# Altium footprint library SMD_Bauteile.PcbLib: 355 footprints (part 2 of 23)
Each footprint in its own frame and in the unit in brackets; x right, y up, seen from the top. Pads: shape width x height; smd on the part's side, far side on the other; paste and mask are expansions set on the pad; w line width, h text height; cw(c..) or ccw(c..) is an arc to the next point about the centre after c.
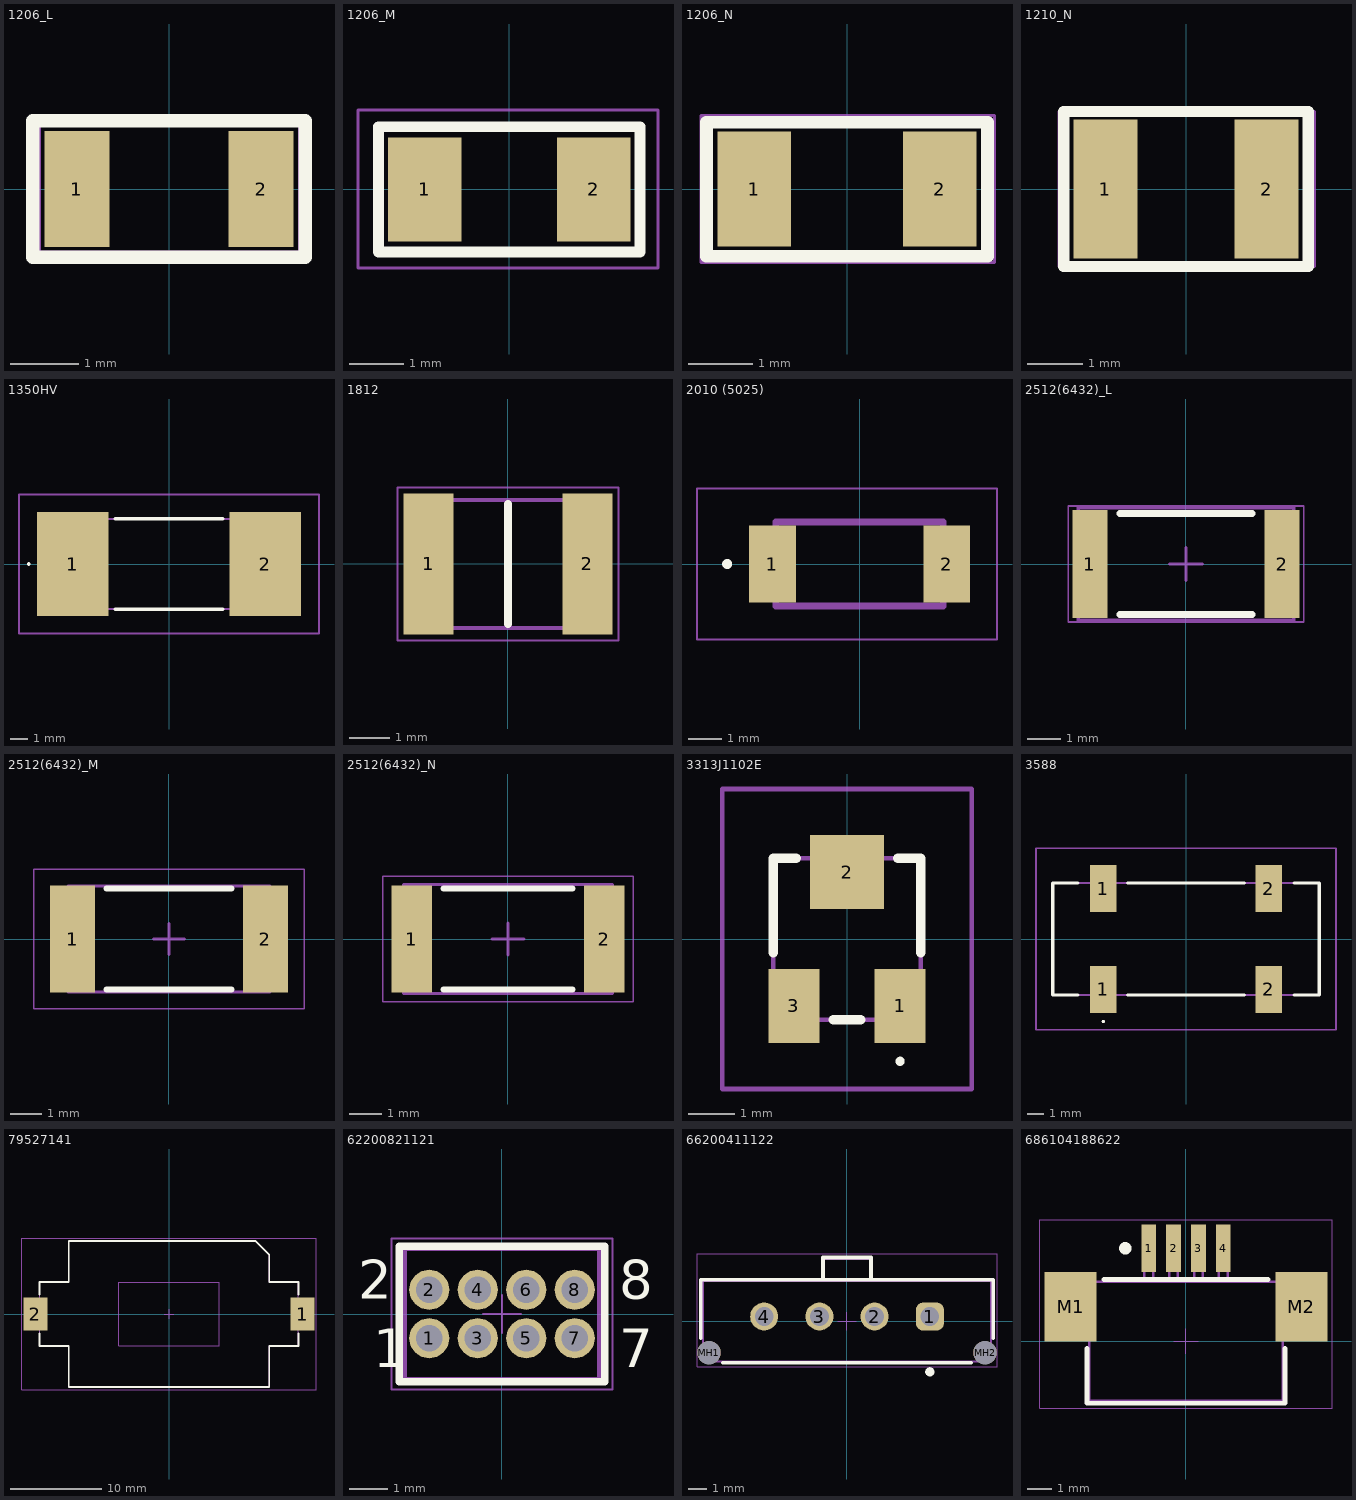
[diagram p1: the footprints below, top view; thin cyan lines are the x and y axes]

## 1206_L [mm]
pads (2):
  rect 0.95x1.7 smd: 1(-1.35,0) 2(1.35,0)
Top Overlay:
  lines w0.2: -2,-1 -2,1 2,1 2,-1 -2,-1
Mech 15:
  lines w0.05: -1.9,-0.924 -1.9,0.976 1.914,0.976 1.914,-0.924 -1.9,-0.924
3D body: height 0.8, standoff 0, extent -0.889,-0.635 1.143,0.635

## 1206_M [mm]
pads (2):
  rect 1.35x1.9 smd: 1(-1.55,0) 2(1.55,0)
Top Overlay:
  lines w0.2: -2.4,-1.15 -2.4,1.15 2.4,1.15 2.4,-1.15 -2.4,-1.15
Mech 15:
  lines w0.05: -2.773,-1.442 -2.773,1.458 2.727,1.458 2.727,-1.442 -2.773,-1.442
3D body: height 0.8, standoff 0, extent -1.016,-0.635 1.016,0.635

## 1206_N [mm]
pads (2):
  rect 1.15x1.8 smd: 1(-1.45,0) 2(1.45,0)
Top Overlay:
  lines w0.2: -2.2,-1.05 -2.2,1.05 2.2,1.05 2.2,-1.05 -2.2,-1.05
Mech 15:
  lines w0.05: -2.288,-1.148 2.312,-1.148 2.312,1.152 -2.288,1.152 -2.288,-1.148
3D body: height 0.8, standoff 0, extent -1.016,-0.635 1.016,0.635

## 1210_N [mm]
pads (2):
  rect 1.15x2.5 smd: 1(-1.45,0) 2(1.45,0)
Top Overlay:
  lines w0.2: -2.2,-1.397 -2.2,1.397 2.2,1.397 2.2,-1.397 -2.2,-1.397
Mech 15:
  lines w0.05: -2.288,-1.397 2.312,-1.397 2.312,1.397 -2.288,1.397 -2.288,-1.397
3D body "Download_STP_885012x09xxx (rev1).stp": height 2.55, standoff 0.05, extent -1.6,-1.25 1.6,1.25

## 1350HV [mm] "Surface Mount Fuses 600V (DC) FAST ACTING"
height 5.5
pads (2):
  rect 4x5.8 smd: 1(-5.4,0) 2(5.4,0)
Top Overlay:
  lines w0.1: -7.9,0 cw(c-7.85,0) -7.8,0 cw(c-7.85,0) -7.9,0
  lines w0.2: -3,-2.525 3,-2.525 ; -3,2.525 3,2.525
Mech Misc 1:
  lines w0.1: -6.6,-2.525 6.6,-2.525 6.6,2.525 -6.6,2.525 -6.6,-2.525
Mech 15:
  lines w0.1: -8.4,-3.9 8.4,-3.9 8.4,3.9 -8.4,3.9 -8.4,-3.9
3D body "TR-1350HV1-6-R.stp": height 5.12, standoff 0.05, extent -6.5,-2.545 6.5,2.525

## 1812 [mm]
pads (2):
  rect 1.25x3.52 smd: 1(-1.98,0) 2(1.98,0)
Top Overlay:
  lines w0.2: 0,-1.5 0,1.5
Mech Misc 1:
  lines w0.1: -2.25,-1.6 -2.25,1.6 2.25,1.6 2.25,-1.6 -2.25,-1.6
Mech 15:
  lines w0.05: -2.755,-1.91 -2.755,1.91 2.755,1.91 2.755,-1.91 -2.755,-1.91
3D body "CKC18C473KWGACAUTO.stp": height 2.7, standoff 0, extent -2.25,-1.6 2.25,1.6

## 2010 (5025) [mm]
pads (2):
  rect 1.4x2.3 smd: 1(-2.6,0) 2(2.6,0)
Top Overlay:
  circle w0.2: c-3.95,0 r0.05
Mech 15:
  lines w0.2: -2.5,-1.25 2.5,-1.25 2.5,1.25 -2.5,1.25 -2.5,-1.25
Top 3D Body:
  lines w0.05: -4.85,-2.25 4.1,-2.25 4.1,2.25 -4.85,2.25 -4.85,-2.25

## 2512(6432)_L [mm] "Chip Resistor, Body 6.4x3.2mm, IPC High Density"
height 0.75
pads (2):
  rect 1.05x3.25 smd: 1(-2.9,0) 2(2.9,0)
Top Overlay:
  lines w0.2: -2,-1.525 2,-1.525 ; -2,1.525 2,1.525
Mech Misc 1:
  lines w0.1: -3.25,-1.7 -3.25,1.7 3.25,1.7 3.25,-1.7 -3.25,-1.7
Mech 15:
  lines w0.05: -3.55,-1.75 -3.55,1.75 3.55,1.75 3.55,-1.75 -3.55,-1.75
  lines w0.1: -0.5,0 0.5,0 ; 0,-0.5 0,0.5
3D body: height 0.75, standoff 0, extent 2.63,-1.7 3.25,1.7
3D body: height 0.75, standoff 0, extent -2.63,-1.7 2.63,1.7
3D body: height 0.75, standoff 0, extent -3.25,-1.7 -2.63,1.7

## 2512(6432)_M [mm] "Chip Resistor, Body 6.4x3.2mm, IPC Low Density"
height 0.75
pads (2):
  rect 1.45x3.45 smd: 1(-3.1,0) 2(3.1,0)
Top Overlay:
  lines w0.2: -2,-1.625 2,-1.625 ; -2,1.625 2,1.625
Mech Misc 1:
  lines w0.1: -3.25,-1.7 -3.25,1.7 3.25,1.7 3.25,-1.7 -3.25,-1.7
Mech 15:
  lines w0.05: -4.35,-2.25 -4.35,2.25 4.35,2.25 4.35,-2.25 -4.35,-2.25
  lines w0.1: -0.5,0 0.5,0 ; 0,-0.5 0,0.5
3D body: height 0.75, standoff 0, extent -3.25,-1.7 -2.63,1.7
3D body: height 0.75, standoff 0, extent -2.63,-1.7 2.63,1.7
3D body: height 0.75, standoff 0, extent 2.63,-1.7 3.25,1.7

## 2512(6432)_N [mm] "Chip Resistor, Body 6.4x3.2mm, IPC Medium Density"
height 0.75
pads (2):
  rect 1.25x3.35 smd: 1(-3,0) 2(3,0)
Top Overlay:
  lines w0.2: -2,-1.575 2,-1.575 ; -2,1.575 2,1.575
Mech Misc 1:
  lines w0.1: -3.25,-1.7 3.25,-1.7 3.25,1.7 -3.25,1.7 -3.25,-1.7
Mech 15:
  lines w0.05: -3.9,-1.95 3.9,-1.95 3.9,1.95 -3.9,1.95 -3.9,-1.95
  lines w0.1: -0.5,0 0.5,0 ; 0,-0.5 0,0.5
3D body: height 0.75, standoff 0, extent -3.25,-1.7 -2.63,1.7
3D body: height 0.75, standoff 0, extent -2.63,-1.7 2.63,1.7
3D body: height 0.75, standoff 0, extent 2.63,-1.7 3.25,1.7

## 3313J1102E [mm]
pads (3):
  rect 1.1x1.6 smd: 1(1.15,-1.45) 3(-1.15,-1.45)
  rect 1.6x1.6 smd: 2(0,1.45)
Top Overlay:
  lines w0.1: 1.15,-2.7 ccw(c1.15,-2.65) 1.15,-2.6 ccw(c1.15,-2.65) 1.15,-2.7
  lines w0.2: -1.6,-0.3 -1.6,1.75 -1.1,1.75 ; -0.3,-1.75 0.3,-1.75 ; 1.1,1.75 1.6,1.75 1.6,-0.3
Mech Misc 1:
  lines w0.1: -1.6,-1.75 -1.6,1.75 1.6,1.75 1.6,-1.75 -1.6,-1.75
Mech 15:
  lines w0.1: -2.7,-3.25 -2.7,3.25 2.7,3.25 2.7,-3.25 -2.7,-3.25
3D body "3313J-1-102E.stp": height 2.4, standoff 0, extent -1.6,-1.75 1.6,1.75

## 3588 [mm]
pads (4):
  rect 1.57x2.82 smd: 1(-4.96,-3.03) 1(-4.96,3.03) 2(4.96,-3.03) 2(4.96,3.03)
Top Overlay:
  lines w0.1: -4.96,-5 ccw(c-4.96,-4.95) -4.96,-4.9 ccw(c-4.96,-4.95) -4.96,-5
  lines w0.2: -6.5,-3.365 -8,-3.365 -8,3.365 -6.5,3.365 ; -3.5,-3.365 3.5,-3.365 ; -3.5,3.365 3.5,3.365 ; 6.5,-3.365 8,-3.365 8,3.365 6.5,3.365
Mech Misc 1:
  lines w0.1: -8,-3.365 8,-3.365 8,3.365 -8,3.365 -8,-3.365
Mech 15:
  lines w0.1: -9,-5.44 9,-5.44 9,5.44 -9,5.44 -9,-5.44
3D body "3D_model_0297000_WXT_MINI.stp": height 17.76, standoff 1.5, extent -5.197,-1.725 5.725,2.085
3D body "3588.stp": height 7.88, standoff 0, extent -7.906,-4.004 8.096,4.752

## 79527141 [mm] "Battery Holder"
height 5.65
pads (2):
  rect 2.6x3.6 smd: 1(14.65,0) 2(-14.65,0)
Top Overlay:
  lines w0.2: -14.2,-2.15 -14.2,-3.5 -11,-3.5 -11,-8 11,-8 11,-3.5 14.2,-3.5 14.2,-2.15 ; -14.2,2.15 -14.2,3.5 -11,3.5 -11,8 9.5,8 11,6.5 11,3.5 14.2,3.5 14.2,2.15
Bottom Designator:
  lines w0.05: -0.5,0 0.5,0 ; 0,-0.5 0,0.5 ; -16.15,-8.3 -16.15,8.3 16.15,8.3 16.15,-8.3 -16.15,-8.3
  lines w0.1: 1.5,3.5 5.5,3.5 ; 5.5,3.5 5.5,-3.5 -5.5,-3.5 -5.5,3.5 5.5,3.5
  text "ZONE FOR ADHESIVE FIXATION" at -7,-4.989 h1
Top Courtyard (Mech14):
  lines w0.1: -14.2,-3.5 -11,-3.5 -11,-8 11,-8 11,-3.5 14.2,-3.5 14.2,3.5 11,3.5 11,6.5 9.5,8 -11,8 -11,3.5 -14.2,3.5 -14.2,-3.5
Mechanical 18:
  lines w0.1: -14.2,-3.5 -14.2,3.5 -11,3.5 -11,8 9.5,8 11,6.5 11,3.5 14.2,3.5 14.2,-3.5 11,-3.5 11,-8 -11,-8 -11,-3.5 -14.2,-3.5
Top 3D Body:
  text ".Designator" at -7.498,-0.5 h1.5
Top Component Outline:
  lines w0.1: 1.5,3.5 5.5,3.5 ; 5.5,3.5 5.5,-3.5 -5.5,-3.5 -5.5,3.5 5.5,3.5
3D body "79527141 (rev1).stp": height 5.66, standoff 0.01, extent -15.95,-8 15.95,8

## 62200821121 [mm] "Pin Header, pitch 1.27 mm, THT, Vertical, dual row, 8p"
height 5.65
pads (8):
  round 1.05 hole 0.7: 1(-1.905,-0.635) 2(-1.905,0.635) 3(-0.635,-0.635) 4(-0.635,0.635) 5(0.635,-0.635) 6(0.635,0.635) 7(1.905,-0.635) 8(1.905,0.635)
Top Overlay:
  lines w0.2: -2.69,-1.775 -2.69,1.775 2.69,1.775 2.69,-1.775 -2.69,-1.775
  text "7" at 3.07,-1.4 h1.02
  text "8" at 3.07,0.4 h1.02
  text "1" at -3.37,-1.4 h1.02
  text "2" at -3.77,0.4 h1.02
Mech Misc 1:
  lines w0.1: -2.54,-1.7 -2.54,1.7 2.54,1.7 2.54,-1.7 -2.54,-1.7
Mech 15:
  lines w0.05: -0.5,0 0.5,0 ; 0,-0.5 0,0.5 ; -2.89,-1.975 -2.89,1.975 2.89,1.975 2.89,-1.975 -2.89,-1.975
3D body "62200821121.stp": height 5.33, standoff -2.27, extent -2.54,-1.7 2.54,1.7

## 66200411122 [mm] "3.00mm Male Single Row Vertical Header, 4p"
height 11
pads (6):
  rrect50% 1.52x1.52 hole 1.02: 1(4.5,0.255)
  round 1.52 hole 1.02: 2(1.5,0.255) 3(-1.5,0.255) 4(-4.5,0.255)
  round 1.27 hole 1.27 unplated: MH1(-7.5,-1.705) MH2(7.5,-1.705)
Top Overlay:
  circle w0.25: c4.5,-2.75 r0.125
  lines w0.2: -7.95,-0.91 -7.95,2.26 7.95,2.26 7.95,-0.91 ; -6.755,-2.26 6.755,-2.26 ; -1.3,2.26 -1.3,3.46 1.3,3.46 1.3,2.26
Bottom Designator:
  lines w0.05: -0.5,0 0.5,0 ; 0,-0.5 0,0.5 ; -8.15,-2.46 8.15,-2.46 8.15,3.66 -8.15,3.66 -8.15,-2.46
Top Courtyard (Mech14):
  lines w0.1: -1.3,2.185 -1.3,3.385 1.3,3.385 1.3,2.185 ; 7.825,-2.185 7.825,2.185 -7.825,2.185 -7.825,-2.185 7.83,-2.185
Mechanical 18:
  lines w0.1: -1.3,2.185 -1.3,3.385 1.3,3.385 1.3,2.185 ; 7.825,-2.185 7.825,2.185 -7.825,2.185 -7.825,-2.185 7.83,-2.185
Top 3D Body:
  text ".Designator" at -7.498,-0.5 h1.5
3D body "66200411122.stp": height 9.93, standoff -3.15, extent -7.822,-2.185 7.828,3.385

## 686104188622 [mm] "LIF Connectors, Horizontal, Top Contact, pitch 1mm, 4p"
height 3.1
pads (6):
  rect 0.6x1.9 smd: 1(-1.5,3.75) 2(-0.5,3.75) 3(0.5,3.75) 4(1.5,3.75)
  rect 2.1x2.8 smd: M1(-4.65,1.4) M2(4.65,1.4)
Top Overlay:
  circle w0.25: c-2.45,3.75 r0.125
  lines w0.2: -4,-0.3 -4,-2.5 4,-2.5 4,-0.3 ; -3.3,2.5 3.3,2.5
Bottom Designator:
  lines w0.05: -0.5,0 0.5,0 ; 0,-0.5 0,0.5 ; -5.9,-2.7 5.9,-2.7 5.9,4.9 -5.9,4.9 -5.9,-2.7
Top Courtyard (Mech14):
  lines w0.1: -1.675,2.4 -1.675,4.4 -1.325,4.4 -1.325,2.4 ; -0.675,2.4 -0.675,4.4 -0.325,4.4 -0.325,2.4 ; 0.325,2.4 0.325,4.4 0.675,4.4 0.675,2.4 ; 1.325,2.4 1.325,4.4 1.675,4.4 1.675,2.4 ; -5.15,0.4 -3.9,0.4 -3.9,-2.4 3.9,-2.4 3.9,0.4 5.15,0.4 5.15,2.4 -5.15,2.4 -5.15,0.4
Mechanical 18:
  lines w0.1: -1.675,2.4 -1.675,4.4 -1.325,4.4 -1.325,2.4 ; -0.675,2.4 -0.675,4.4 -0.325,4.4 -0.325,2.4 ; 0.325,2.4 0.325,4.4 0.675,4.4 0.675,2.4 ; 1.325,2.4 1.325,4.4 1.675,4.4 1.675,2.4 ; -5.15,0.4 -5.15,2.4 5.15,2.4 5.15,0.4 3.9,0.4 3.9,-2.4 -3.9,-2.4 -3.9,0.4 -5.15,0.4
Top 3D Body:
  text ".Designator" at -7.498,-0.5 h1.5
3D body "686104188622.stp": height 3.1, standoff -0.01, extent -5.15,-2.4 5.15,4.4